# Altium footprint library Cymometer.PcbLib: 22 footprints (part 1 of 2)
Each footprint in its own frame and in the unit in brackets; x right, y up, seen from the top. Pads: shape width x height; smd on the part's side, far side on the other; paste and mask are expansions set on the pad; w line width, h text height; cw(c..) or ccw(c..) is an arc to the next point about the centre after c.
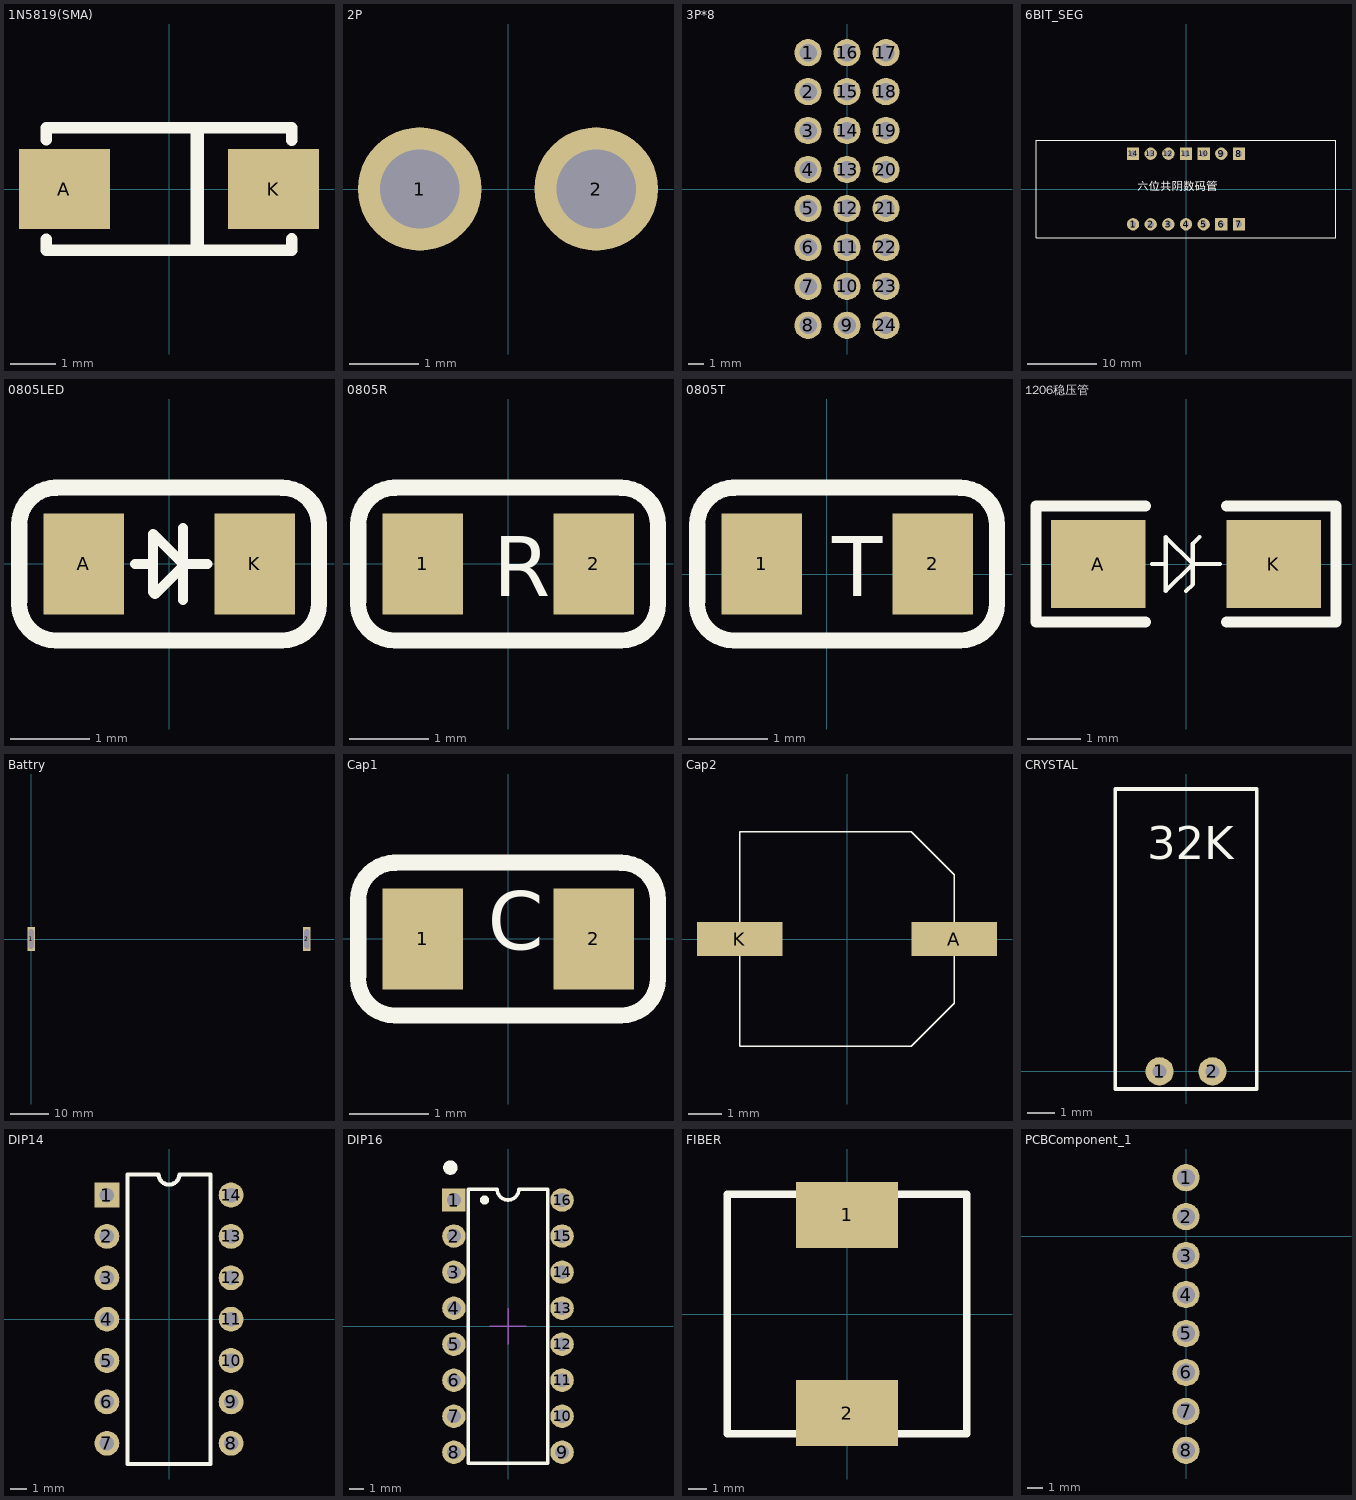
[diagram p0: the footprints below, top view; thin cyan lines are the x and y axes]

## 1N5819(SMA) [mm]
pads (2):
  rect 2x1.75 smd: A(-2.3,0) K(2.3,0)
Top Overlay:
  lines w0.254: -2.7,-1.105 -2.7,-1.35 2.7,-1.35 2.7,-1.1 ; -2.7,1.08 -2.7,1.35 2.695,1.35 ; 2.7,1.075 2.7,1.35
  lines w0.3: 0.62,-1.3 0.62,1.3
3D body: height 2.12, standoff -0.02, extent -2.498,-1.342 2.608,1.325

## 2P [mil]
pads (2):
  round 70 hole 45: 1(-50,0) 2(50,0)

## 3P*8 [mil]
pads (24):
  round 70 hole 45: 1(-100,350) 2(-100,250) 3(-100,150) 4(-100,50) 5(-100,-50) 6(-100,-150) 7(-100,-250) 8(-100,-350) 9(0,-350) 10(0,-250) 11(0,-150) 12(0,-50) 13(0,50) 14(0,150) 15(0,250) 16(0,350) 17(100,350) 18(100,250) 19(100,150) 20(100,50) 21(100,-50) 22(100,-150) 23(100,-250) 24(100,-350)

## 6BIT_SEG [mil]
pads (14):
  round 70 hole 35: 1(-300,-200) 2(-200,-200) 3(-100,-200) 4(0,-200) 5(100,-200) 9(200,200) 12(-100,200) 13(-200,200)
  rect 70x70 hole 35: 6(200,-200) 7(300,-200) 8(300,200) 10(100,200) 11(0,200) 14(-300,200)
Top Overlay:
  lines w5: -850,-275 -850,275 0,275 850,275 850,-275 -850,-275
  text "六位共阴数码管" at -275,-25 h80

## 0805LED [mil]
pads (2):
  rect 40x50 smd: A(-42.5,0) K(42.5,0)
Top Overlay:
  lines w5: -17,0 -8,0 ; 7,-18 7,18 ; 19,0 7,0 ; -8,0 -8,-14 -7,-15 7,-1 7,0 ; -8,0 -8,15 7,0
  lines w8: -74.61,-19.59 ccw(c-56.2,-19.59) -56.2,-38 ; -74.5,-18.5 -74.5,18.5 ; -74.5,19.5 cw(c-56.09,19.5) -56.09,37.91 ; -56.62,38 55.59,38 ; -55.2,-38 55.61,-38 ; 56.09,-38 ccw(c56.09,-19.59) 74.5,-19.59 ; 56.09,37.91 cw(c56.09,19.5) 74.5,19.5 ; 74.5,-18.59 74.5,18.5

## 0805R [mil]
pads (2):
  rect 40x50 smd: 1(-42.5,0) 2(42.5,0)
Top Overlay:
  lines w8: -74.61,-19.59 ccw(c-56.2,-19.59) -56.2,-38 ; -74.5,-18.5 -74.5,18.5 ; -74.5,19.5 cw(c-56.09,19.5) -56.09,37.91 ; -56.62,38 55.59,38 ; -55.2,-38 55.61,-38 ; 56.09,-38 ccw(c56.09,-19.59) 74.5,-19.59 ; 56.09,37.91 cw(c56.09,19.5) 74.5,19.5 ; 74.5,-18.59 74.5,18.5
  text "R" at -7.5,-16 h30
3D body: height 30.39, standoff -0.39, extent -39.24,-24.61 39.5,24.61

## 0805T [mil]
pads (2):
  rect 40x50 smd: 1(-32.5,5) 2(52.5,5)
Top Overlay:
  lines w8: -64.61,-14.59 ccw(c-46.2,-14.59) -46.2,-33 ; -64.5,-13.5 -64.5,23.5 ; -64.5,24.5 cw(c-46.09,24.5) -46.09,42.91 ; -46.62,43 65.59,43 ; -45.2,-33 65.61,-33 ; 66.09,-33 ccw(c66.09,-14.59) 84.5,-14.59 ; 66.09,42.91 cw(c66.09,24.5) 84.5,24.5 ; 84.5,-13.59 84.5,23.5
  text "T" at 2.5,-11 h30
3D body: height 30.39, standoff -0.39, extent -29.24,-19.61 49.5,29.61

## 1206稳压管 [mil]
pads (2):
  rect 70x65 smd: A(-65,0) K(65,0)
Top Overlay:
  lines w3: -25,0 -15,0 ; 0,-20 5,-15 5,0 ; 10,20 5,15 5,0 ; 25,0 5,0 ; -15,0 -15,20 5,0 ; -15,0 -15,-20 5,0
  lines w8: -30,-43 -111,-43 -111,43 -109,43 -30,43 ; 30,-43 109,-43 ; 30,43 111,43 111,-43

## Battry [mil]
pads (2):
  rect 80x250 hole 50 slot 200 at 90 deg: 1(0,0) 2(2834.65,0)

## Cap1 [mil]
pads (2):
  rect 40x50 smd: 1(-42.5,0) 2(42.5,0)
Top Overlay:
  lines w8: -74.61,-19.59 ccw(c-56.2,-19.59) -56.2,-38 ; -74.5,-18.5 -74.5,18.5 ; -74.5,19.5 cw(c-56.09,19.5) -56.09,37.91 ; -56.62,38 55.59,38 ; -55.2,-38 55.61,-38 ; 56.09,-38 ccw(c56.09,-19.59) 74.5,-19.59 ; 56.09,37.91 cw(c56.09,19.5) 74.5,19.5 ; 74.5,-18.59 74.5,18.5
  text "C" at -10,-15 h50
3D body: height 30.39, standoff -0.39, extent -39.35,-24.61 39.39,24.61

## Cap2 [mil]
pads (2):
  rect 100x40 smd: A(125,0) K(-125,0)
Top Overlay:
  lines w2: -125,-125 75,-125 125,-75 125,75 75,125 -125,125 -125,-125

## CRYSTAL [mil]
pads (2):
  round 40 hole 20: 1(-37.5,0) 2(37.5,0)
Top Overlay:
  lines w5: -100,-25 -100,400 100,400 100,-25 0,-25 -100,-25
  text "32K" at -55,285 h80

## DIP14 [mil]
pads (14):
  rect 60x60 hole 35: 1(-150,300)
  round 60 hole 35: 2(-150,200) 3(-150,100) 4(-150,0) 5(-150,-100) 6(-150,-200) 7(-150,-300) 8(150,-300) 9(150,-200) 10(150,-100) 11(150,0) 12(150,100) 13(150,200) 14(150,300)
Top Overlay:
  lines w10: -100,-350 100,-350 100,350 25,350 cw(c0,350) -25,350 -100,350 -100,-350

## DIP16 [mil]
pads (16):
  rect 65x65 hole 38: 1(-150,350)
  round 65 hole 38: 2(-150,250) 3(-150,150) 4(-150,50) 5(-150,-50) 6(-150,-150) 7(-150,-250) 8(-150,-350) 9(150,-350) 10(150,-250) 11(150,-150) 12(150,-50) 13(150,50) 14(150,150) 15(150,250) 16(150,350)
Top Overlay:
  circle w20: c-160,440 r10
  circle w15: c-65,350 r5
  lines w10: -110,-380 110,-380 110,380 30,380 cw(c0,380) 0,350 cw(c0,380) -30,380 -110,380 -110,-380
Mechanical 15:
  lines w3.94: -50,0 50,0 ; 0,-50 0,50
3D body: height 177.17, standoff -125.98, extent -154.53,-379.92 154.52,379.92

## FIBER [mm]
pads (2):
  rect 5.4x3.5 smd: 1(0,5.25) 2(0,-5.25)
Top Overlay:
  lines w0.381: -6.35,-6.35 -6.35,6.35 6.35,6.35 6.35,0 6.35,-6.35 -6.35,-6.35

## PCBComponent_1 [mil]
pads (8):
  round 70 hole 45: 1(0,150) 2(0,50) 3(0,-50) 4(0,-150) 5(0,-250) 6(0,-350) 7(0,-450) 8(0,-550)